# Altium footprint library KNR_Kurs.PcbLib: 250 footprints (part 2 of 16)
Each footprint in its own frame and in the unit in brackets; x right, y up, seen from the top. Pads: shape width x height; smd on the part's side, far side on the other; paste and mask are expansions set on the pad; w line width, h text height; cw(c..) or ccw(c..) is an arc to the next point about the centre after c.
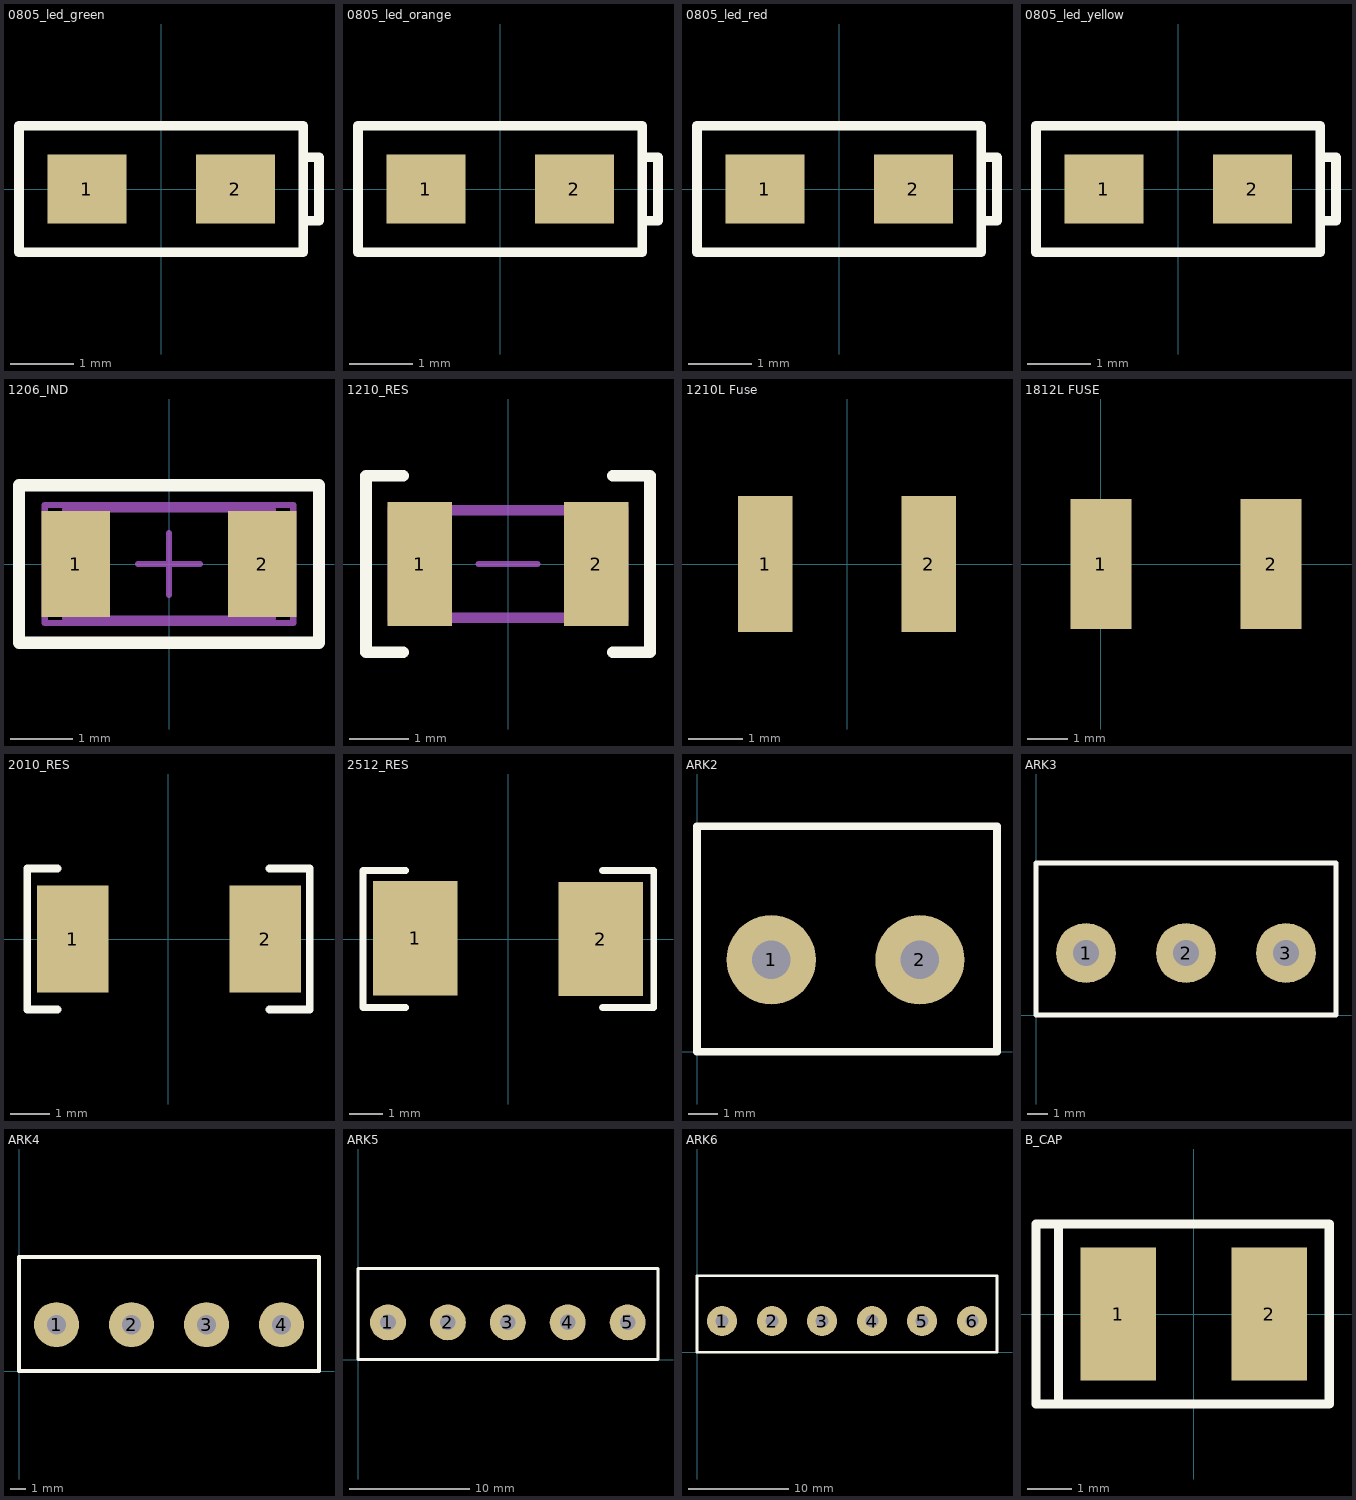
[diagram p1: the footprints below, top view; thin cyan lines are the x and y axes]

## 0805_led_green [mm]
pads (2):
  rect 1.25x1.1 smd: 1(-1.175,0) 2(1.175,0)
Top Overlay:
  lines w0.152: 2.25,-0.5 2.5,-0.5 2.5,0.5 2.25,0.5 ; -2.25,-1 -2.25,1 2.25,1 2.25,-1 -2.25,-1
3D body "0805_led_green.stp": height 0.6, standoff 0, extent -1,-0.625 1,0.625

## 0805_led_orange [mm]
pads (2):
  rect 1.25x1.1 smd: 1(-1.175,0) 2(1.175,0)
Top Overlay:
  lines w0.152: 2.25,-0.5 2.5,-0.5 2.5,0.5 2.25,0.5 ; -2.25,-1 2.25,-1 2.25,1 -2.25,1 -2.25,-1
3D body "0805_led_orange.stp": height 0.6, standoff 0, extent -1,-0.625 1,0.625

## 0805_led_red [mm]
pads (2):
  rect 1.25x1.1 smd: 1(-1.175,0) 2(1.175,0)
Top Overlay:
  lines w0.152: 2.25,-0.5 2.5,-0.5 2.5,0.5 2.25,0.5 ; -2.25,-1 2.25,-1 2.25,1 -2.25,1 -2.25,-1
3D body "0805_led_red.stp": height 0.6, standoff 0, extent -1,-0.625 1,0.625

## 0805_led_yellow [mm]
pads (2):
  rect 1.25x1.1 smd: 1(-1.175,0) 2(1.175,0)
Top Overlay:
  lines w0.152: 2.25,-0.5 2.5,-0.5 2.5,0.5 2.25,0.5 ; -2.25,-1 -2.25,1 2.25,1 2.25,-1 -2.25,-1
3D body "0805_led_yellow.stp": height 0.6, standoff 0, extent -1,-0.625 1,0.625

## 1206_IND [mm] "3216(metric)"
height 2.54
pads (2):
  rect 1.1x1.7 smd: 1(-1.499,0) 2(1.499,0)
Top Overlay:
  lines w0.2: -2.413,-1.27 -2.413,1.27 1.778,1.27 2.413,1.27 2.413,-1.27 1.778,-1.27 -2.413,-1.27
Mechanical 13:
  lines w0.1: -1.675,-0.875 -1.675,0.875 1.675,0.875 1.675,-0.875 -1.675,-0.875
Mechanical 15:
  lines w0.1: -0.5,0 0.5,0 ; 0,-0.5 0,0.5 ; -2,-0.95 -2,0.95 2,0.95 2,-0.95 -2,-0.95
3D body "1206.stp": height 0.81, standoff 0, extent -1.61,-0.813 1.61,0.807

## 1210_RES [mm]
pads (2):
  rect 1.1x2.1 smd: 1(-1.499,0) 2(1.499,0)
Top Overlay:
  lines w0.2: -1.778,-1.5 -2.413,-1.5 -2.413,1.5 -1.778,1.5 ; 1.778,-1.5 2.413,-1.5 2.413,1.5 1.778,1.5
Mechanical 13:
  lines w0.1: -1.675,-0.875 -1.675,0.875 1.675,0.875 1.675,-0.875 -1.675,-0.875
Mechanical 15:
  lines w0.1: -0.5,0 0.5,0 ; -2,-0.95 -2,0.95 2,0.95 2,-0.95 -2,-0.95
3D body "1206.stp": height 0.81, standoff 0, extent -1.61,-0.813 1.61,0.807

## 1210L Fuse [mm]
pads (2):
  rect 1x2.5 smd mask+0.07: 1(-1.5,0) 2(1.5,0)
3D body "User Library-Fuse1210.step": height 0.67, standoff 0, extent -1.607,-1.287 1.608,1.288

## 1812L FUSE [mm]
pads (2):
  rect 1.5x3.2 smd mask+0.07: 1(0,0) 2(4.2,0)
3D body "User Library-0ZCG-0_70mm.step": height 1.55, standoff 0, extent -0.15,-1.6 4.35,1.6

## 2010_RES [mm] "Chip Resistor; Body 5 x 2.5 mm (LxW typ)"
height 0.7
pads (2):
  rect 1.8x2.7 smd: 1(-2.413,0) 2(2.438,0)
Top Overlay:
  lines w0.2: -2.794,-1.778 -3.556,-1.778 -3.556,1.778 -2.794,1.778 ; 2.54,-1.778 3.556,-1.778 3.556,1.778 2.54,1.778
3D body "2010.stp": height 0.81, standoff 0, extent -2.51,-1.27 2.51,1.25

## 2512_RES [mm] "Chip Resistor; Body 6.4 x 3.2 mm (LxW typ)"
height 1.2
pads (2):
  rect 2.5x3.4 smd: 1(-2.769,0.025) 2(2.743,0)
Top Overlay:
  lines w0.2: -3.048,-2.032 -4.318,-2.032 -4.318,2.032 -3.048,2.032 ; 2.794,-2.032 4.318,-2.032 4.318,2.032 2.794,2.032
3D body "2512.stp": height 0.81, standoff -0.01, extent -3.3,-1.61 3.3,1.61

## ARK2 [mm]
pads (2):
  round 3 hole 1.3: 1(2.5,3.1) 2(7.5,3.1)
Top Overlay:
  lines w0.254: 0,0 10.098,0 10.098,7.6 0,7.6 0,0
3D body "ARK2.stp": height 10, standoff 0, extent 0,0 10,7.6

## ARK3 [mm]
pads (3):
  round 3 hole 1.3: 1(2.5,3.1) 2(7.5,3.1) 3(12.5,3.1)
Top Overlay:
  lines w0.254: 0,0 0,7.6 15,7.6 15,0 0,0
3D body "ARK3.stp": height 10, standoff 0, extent 0,0 15,7.6

## ARK4 [mm]
pads (4):
  round 3 hole 1.3: 1(2.5,3.1) 2(7.5,3.1) 3(12.5,3.1) 4(17.5,3.1)
Top Overlay:
  lines w0.254: 0,0 5,0 10,0 15,0 20,0 20,7.62 15,7.62 10,7.62 5,7.62 0,7.62 0,0
3D body "ARK4.stp": height 10, standoff 0, extent 0,0 20,7.6

## ARK5 [mm]
pads (5):
  round 3 hole 1.3: 1(2.5,3.1) 2(7.5,3.1) 3(12.5,3.1) 4(17.5,3.1) 5(22.5,3.1)
Top Overlay:
  lines w0.254: 0,0 25.033,0 25.033,7.6 0,7.6 0,0
3D body "ARK5.stp": height 10, standoff 0, extent 0,0 25,7.6

## ARK6 [mm]
pads (6):
  round 3 hole 1.3: 1(2.5,3.1) 2(7.5,3.1) 3(12.5,3.1) 4(17.5,3.1) 5(22.5,3.1) 6(27.5,3.1)
Top Overlay:
  lines w0.254: 0,0 5,0 10,0 15,0 20,0 25,0 30,0 30,7.62 25,7.62 20,7.62 15,7.62 10,7.62 5,7.62 0,7.62 0,0
3D body "ARK6.stp": height 10, standoff 0, extent 0,0 30,7.6

## B_CAP [mm]
pads (2):
  rect 1.7x3 smd: 1(-1.7,0) 2(1.7,0)
Top Overlay:
  lines w0.203: -3.048,-2.032 3.048,-2.032 3.048,2.032 -3.048,2.032 ; -3.048,-2.032 -3.048,2.032 ; -3.048,-2.032 -3.556,-2.032 -3.556,2.032 -3.048,2.032
3D body "SW3dPS-Solid Tantalum Chip Capacitor.STEP": height 2.11, standoff -0.04, extent -2.515,-1.499 2.484,1.499